# Altium footprint library IDETEC.PcbLib: 275 footprints (part 9 of 18) (continued)
## Logo de Ideas [mm] "logo de Idetec" (continued)
0.576,0.791 ; 0.093,1.451 0.423,1.451 ; 0.093,1.807 0.246,1.807 ; 0.093,1.832 0.246,1.832 ; 0.093,1.858 0.246,1.858 ; 0.093,1.883 0.22,1.883 ; 0.093,1.909 0.246,1.909 ; 0.119,1.477 0.423,1.477 ; 0.119,1.705 0.271,1.705 ; 0.119,1.731 0.271,1.731 ; 0.119,1.756 0.246,1.756 ; 0.119,1.782 0.246,1.782 ; 0.119,1.934 0.246,1.934 ; 0.119,1.959 0.246,1.959 ; 0.119,1.985 0.246,1.985 ; 0.119,2.01 0.271,2.01 ; 0.144,0.766 0.525,0.766 ; 0.144,1.502 0.398,1.502 ; 0.144,1.655 0.296,1.655 ; 0.144,1.68 0.271,1.68 ; 0.144,2.036 0.271,2.036 ; 0.144,2.061 0.296,2.061 ; 0.169,1.528 0.398,1.528 ; 0.169,1.578 0.474,1.578 ; 0.169,1.604 0.5,1.604 ; 0.169,1.629 0.322,1.629 ; 0.169,2.086 0.347,2.086 ; 0.169,2.112 0.601,2.112 ; 0.195,-0.327 0.449,-0.327 ; 0.195,-0.301 0.449,-0.301 ; 0.195,-0.276 0.449,-0.276 ; 0.195,-0.25 0.449,-0.25 ; 0.195,-0.225 0.449,-0.225 ; 0.195,-0.2 0.449,-0.2 ; 0.195,0.74 0.474,0.74 ; 0.195,1.553 0.449,1.553 ; 0.195,2.137 0.576,2.137 ; 0.22,-0.377 0.423,-0.377 ; 0.22,-0.352 0.423,-0.352 ; 0.22,-0.174 0.449,-0.174 ; 0.22,-0.149 0.423,-0.149 ; 0.22,-0.123 0.423,-0.123 ; 0.22,2.163 0.55,2.163 ; 0.246,-0.403 0.423,-0.403 ; 0.246,-0.098 0.398,-0.098 ; 0.271,-0.428 0.373,-0.428 ; 0.271,-0.073 0.373,-0.073 ; 0.271,0.715 0.373,0.715 ; 0.271,1.426 0.449,1.426 ; 0.271,2.188 0.5,2.188 ; 0.296,1.401 0.474,1.401 ; 0.322,1.35 0.5,1.35 ; 0.322,1.375 0.474,1.375 ; 0.347,1.324 0.525,1.324 ; 0.347,1.629 0.525,1.629 ; 0.347,2.213 0.449,2.213 ; 0.373,1.274 0.55,1.274 ; 0.373,1.299 0.525,1.299 ; 0.373,1.655 0.55,1.655 ; 0.398,1.248 0.576,1.248 ; 0.398,1.68 0.576,1.68 ; 0.423,-0.581 1.185,-0.581 ; 0.423,0.08 1.16,0.08 ; 0.423,1.223 0.601,1.223 ; 0.423,1.705 0.601,1.705 ; 0.423,2.086 0.601,2.086 ; 0.449,0.867 0.652,0.867 ; 0.449,1.172 0.627,1.172 ; 0.449,1.197 0.601,1.197 ; 0.449,1.731 0.601,1.731 ; 0.474,-0.555 1.135,-0.555 ; 0.474,0.054 1.109,0.054 ; 0.474,1.147 0.652,1.147 ; 0.474,1.756 0.627,1.756 ; 0.474,2.036 0.627,2.036 ; 0.474,2.061 0.627,2.061 ; 0.5,-0.53 1.109,-0.53 ; 0.5,0.029 1.084,0.029 ; 0.5,0.893 0.83,0.893 ; 0.5,1.096 0.804,1.096 ; 0.5,1.121 0.652,1.121 ; 0.5,1.782 0.627,1.782 ; 0.5,1.807 0.627,1.807 ; 0.5,1.832 0.627,1.832 ; 0.5,1.985 0.652,1.985 ; 0.5,2.01 0.627,2.01 ; 0.525,-0.504 1.084,-0.504 ; 0.525,-0.479 1.058,-0.479 ; 0.525,-0.022 1.058,-0.022 ; 0.525,0.004 1.058,0.004 ; 0.525,0.918 0.804,0.918 ; 0.525,1.07 0.804,1.07 ; 0.525,1.858 0.652,1.858 ; 0.525,1.883 0.652,1.883 ; 0.525,1.909 0.652,1.909 ; 0.525,1.934 0.652,1.934 ; 0.525,1.959 0.652,1.959 ; 0.55,-0.454 1.058,-0.454 ; 0.55,-0.428 1.033,-0.428 ; 0.55,-0.073 1.033,-0.073 ; 0.55,-0.047 1.033,-0.047 ; 0.55,0.943 0.804,0.943 ; 0.55,1.045 0.779,1.045 ; 0.576,-0.403 1.033,-0.403 ; 0.576,-0.377 1.008,-0.377 ; 0.576,-0.352 1.008,-0.352 ; 0.576,-0.149 1.008,-0.149 ; 0.576,-0.123 1.008,-0.123 ; 0.576,-0.098 1.033,-0.098 ; 0.576,0.969 0.779,0.969 ; 0.576,0.994 0.754,0.994 ; 0.576,1.02 0.779,1.02 ; 0.601,-0.327 1.008,-0.327 ; 0.601,-0.301 1.008,-0.301 ; 0.601,-0.276 1.008,-0.276 ; 0.601,-0.25 1.008,-0.25 ; 0.601,-0.225 1.008,-0.225 ; 0.601,-0.2 1.008,-0.2 ; 0.601,-0.174 1.008,-0.174 ; 0.677,0.842 0.855,0.842 ; 0.677,0.867 0.855,0.867 ; 0.677,1.121 0.83,1.121 ; 0.703,0.816 0.881,0.816 ; 0.703,1.147 0.83,1.147 ; 0.703,1.172 0.855,1.172 ; 0.728,0.791 0.906,0.791 ; 0.728,1.197 0.855,1.197 ; 0.728,1.223 0.855,1.223 ; 0.728,1.248 0.855,1.248 ; 0.754,0.766 0.931,0.766 ; 0.754,1.274 0.881,1.274 ; 0.754,1.299 0.881,1.299 ; 0.754,1.324 0.881,1.324 ; 0.754,1.35 0.881,1.35 ; 0.754,1.375 0.906,1.375 ; 0.779,0.74 0.931,0.74 ; 0.779,1.401 0.906,1.401 ; 0.779,1.426 0.906,1.426 ; 0.779,1.451 0.906,1.451 ; 0.779,1.477 0.906,1.477 ; 0.779,1.502 0.906,1.502 ; 0.779,1.528 0.931,1.528 ; 1.109,-0.631 1.363,-0.631 ; 1.16,-0.352 1.363,-0.352 ; 1.16,-0.327 1.363,-0.327 ; 1.16,-0.301 1.363,-0.301 ; 1.16,-0.276 1.389,-0.276 ; 1.16,-0.25 1.389,-0.25 ; 1.16,-0.225 1.389,-0.225 ; 1.16,-0.2 1.389,-0.2 ; 1.16,-0.174 1.363,-0.174 ; 1.16,-0.149 1.363,-0.149 ; 1.16,-0.123 1.363,-0.123 ; 1.185,-0.682 1.363,-0.682 ; 1.185,-0.657 1.363,-0.657 ; 1.185,-0.403 1.338,-0.403 ; 1.185,-0.377 1.338,-0.377 ; 1.185,-0.098 1.338,-0.098 ; 1.211,-0.073 1.338,-0.073 ; 1.236,-0.708 1.287,-0.708 ; 1.236,-0.428 1.287,-0.428 ; 1.236,-0.047 1.287,-0.047 ; 1.262,-0.581 1.363,-0.581 ; 1.312,-0.555 1.363,-0.555 ; 1.312,0.08 1.389,0.08 ; 1.338,-0.53 1.389,-0.53 ; 1.338,0.054 1.389,0.054 ; 1.363,-0.504 1.389,-0.504 ; 1.363,0.029 1.389,0.029 ; 1.389,-0.835 3.776,-0.835 ; 1.439,-0.809 3.776,-0.809 ; 1.465,-0.784 3.776,-0.784 ; 1.465,-0.758 3.776,-0.758 ; 1.49,-0.733 3.776,-0.733 ; 1.49,-0.708 3.776,-0.708 ; 1.516,-0.682 3.776,-0.682 ; 1.516,-0.657 3.776,-0.657 ; 1.516,-0.631 3.776,-0.631 ; 1.516,-0.606 3.776,-0.606 ; 1.516,-0.581 1.998,-0.581 ; 1.516,-0.555 1.998,-0.555 ; 1.516,-0.53 1.998,-0.53 ; 1.516,-0.504 1.998,-0.504 ; 1.516,-0.479 1.998,-0.479 ; 1.516,-0.454 1.998,-0.454 ; 1.516,-0.428 1.998,-0.428 ; 1.516,-0.403 1.998,-0.403 ; 1.516,-0.377 1.998,-0.377 ; 1.516,-0.352 1.998,-0.352 ; 1.516,-0.327 1.998,-0.327 ; 1.516,-0.301 1.998,-0.301 ; 1.516,-0.276 1.998,-0.276 ; 1.516,-0.25 1.998,-0.25 ; 1.516,-0.225 1.998,-0.225 ; 1.516,-0.2 1.998,-0.2 ; 1.516,-0.174 1.998,-0.174 ; 1.516,-0.149 1.998,-0.149 ; 1.516,-0.123 1.998,-0.123 ; 1.516,-0.098 1.998,-0.098 ; 1.516,-0.073 1.998,-0.073 ; 1.516,-0.047 1.998,-0.047 ; 1.516,-0.022 1.998,-0.022 ; 1.516,0.004 1.998,0.004 ; 1.516,0.029 1.998,0.029 ; 1.516,0.054 1.998,0.054 ; 1.516,0.08 1.998,0.08 ; 2.074,0.181 3.776,0.181 ; 2.1,0.207 3.776,0.207 ; 2.1,0.232 3.776,0.232 ; 2.125,-0.581 2.481,-0.581 ; 2.125,-0.555 2.455,-0.555 ; 2.125,-0.53 2.43,-0.53 ; 2.125,-0.504 2.405,-0.504 ; 2.125,-0.479 2.405,-0.479 ; 2.125,-0.454 2.379,-0.454 ; 2.125,-0.428 2.379,-0.428 ; 2.125,-0.403 2.379,-0.403 ; 2.125,-0.377 2.379,-0.377 ; 2.125,-0.352 2.379,-0.352 ; 2.125,-0.327 2.405,-0.327 ; 2.125,-0.301 2.405,-0.301 ; 2.125,-0.276 2.43,-0.276 ; 2.125,-0.25 2.43,-0.25 ; 2.125,-0.225 2.481,-0.225 ; 2.125,-0.2 2.532,-0.2 ; 2.125,-0.174 2.633,-0.174 ; 2.125,-0.149 2.709,-0.149 ; 2.125,-0.123 2.506,-0.123 ; 2.125,-0.098 2.405,-0.098 ; 2.125,-0.073 2.405,-0.073 ; 2.125,-0.047 2.405,-0.047 ; 2.125,-0.022 2.43,-0.022 ; 2.125,0.004 2.43,0.004 ; 2.125,0.029 2.455,0.029 ; 2.125,0.054 2.481,0.054 ; 2.125,0.08 2.532,0.08 ; 2.125,0.258 3.776,0.258 ; 2.151,0.283 3.776,0.283 ; 2.176,0.308 3.776,0.308 ; 2.176,0.334 3.776,0.334 ; 2.532,-0.428 2.684,-0.428 ; 2.532,-0.403 2.684,-0.403 ; 2.532,-0.377 2.709,-0.377 ; 2.532,-0.352 2.709,-0.352 ; 2.532,-0.123 2.709,-0.123 ; 2.532,-0.098 2.709,-0.098 ; 2.557,-0.454 2.659,-0.454 ; 2.557,-0.327 2.709,-0.327 ; 2.557,-0.073 2.684,-0.073 ; 2.582,-0.047 2.659,-0.047 ; 2.608,-0.301 2.709,-0.301 ; 2.633,-0.581 2.735,-0.581 ; 2.684,-0.555 2.735,-0.555 ; 2.684,-0.276 2.709,-0.276 ; 2.709,-0.53 2.735,-0.53 ; 2.735,0.08 3.776,0.08 ; 2.786,0.054 3.776,0.054 ; 2.811,0.029 3.776,0.029 ; 2.836,-0.403 3.776,-0.403 ; 2.836,-0.377 3.776,-0.377 ; 2.836,-0.352 3.776,-0.352 ; 2.836,-0.327 3.776,-0.327 ; 2.836,-0.301 3.776,-0.301 ; 2.836,-0.276 3.776,-0.276 ; 2.836,-0.25 3.776,-0.25 ; 2.836,-0.225 3.776,-0.225 ; 2.836,-0.2 3.776,-0.2 ; 2.836,-0.174 3.776,-0.174 ; 2.836,-0.149 3.776,-0.149 ; 2.836,-0.123 3.776,-0.123 ; 2.836,-0.098 3.776,-0.098 ; 2.836,-0.073 3.776,-0.073 ; 2.836,-0.047 3.776,-0.047 ; 2.836,-0.022 3.776,-0.022 ; 2.836,0.004 3.776,0.004 ; 2.862,-0.581 3.776,-0.581 ; 2.862,-0.555 3.776,-0.555 ; 2.862,-0.53 3.776,-0.53 ; 2.862,-0.504 3.776,-0.504 ; 2.862,-0.479 3.776,-0.479 ; 2.862,-0.454 3.776,-0.454 ; 2.862,-0.428 3.776,-0.428 ; 4.056,0.131 6.215,0.131 ; 4.056,0.156 4.411,0.156 ; 4.081,0.105 4.259,0.105 ; 4.081,0.181 4.411,0.181 ; 4.081,0.207 4.411,0.207 ; 4.081,0.232 4.411,0.232 ; 4.081,0.258 4.411,0.258 ; 4.081,0.283 4.437,0.283 ; 4.081,0.308 4.437,0.308 ; 4.106,0.08 4.259,0.08 ; 4.106,0.334 4.437,0.334 ; 4.106,0.359 4.437,0.359 ; 4.132,0.054 4.233,0.054 ; 4.157,0.029 4.233,0.029 ; 4.157,0.385 4.411,0.385 ; 4.183,0.004 4.208,0.004 ; 4.183,2.163 4.31,2.163 ; 4.208,0.41 4.386,0.41 ; 4.208,2.137 4.614,2.137 ; 4.259,-0.073 6.215,-0.073 ; 4.259,-0.047 6.215,-0.047 ; 4.259,-0.022 6.215,-0.022 ; 4.259,0.004 6.215,0.004 ; 4.259,0.435 4.386,0.435 ; 4.259,2.112 4.31,2.112 ; 4.284,0.029 6.215,0.029 ; 4.284,0.054 6.215,0.054 ; 4.284,0.08 6.215,0.08 ; 4.284,0.105 6.215,0.105 ; 4.31,-0.098 6.215,-0.098 ; 4.31,0.461 4.36,0.461 ; 4.31,2.086 4.335,2.086 ; 4.335,-0.301 6.189,-0.301 ; 4.335,-0.276 6.215,-0.276 ; 4.335,-0.25 6.215,-0.25 ; 4.335,-0.225 6.215,-0.225 ; 4.335,-0.2 6.215,-0.2 ; 4.335,-0.174 6.215,-0.174 ; 4.335,-0.149 6.215,-0.149 ; 4.335,-0.123 6.215,-0.123 ; 4.335,2.112 4.97,2.112 ; 4.36,-0.327 6.189,-0.327 ; 4.386,-0.352 6.189,-0.352 ; 4.386,2.061 5.072,2.061 ; 4.386,2.086 5.021,2.086 ; 4.411,-0.403 4.614,-0.403 ; 4.411,-0.377 6.189,-0.377 ; 4.411,2.036 4.462,2.036 ; 4.437,-0.428 4.589,-0.428 ; 4.437,0.156 6.215,0.156 ; 4.437,0.181 6.215,0.181 ; 4.462,-0.454 4.589,-0.454 ; 4.462,0.207 6.189,0.207 ; 4.462,0.232 6.189,0.232 ; 4.487,-0.479 4.564,-0.479 ; 4.487,0.258 6.189,0.258 ; 4.487,0.283 6.189,0.283 ; 4.487,2.01 4.513,2.01 ; 4.487,2.036 4.538,2.036 ; 4.513,-0.53 4.538,-0.53 ; 4.513,-0.504 4.564,-0.504 ; 4.513,0.308 6.189,0.308 ; 4.513,0.334 6.189,0.334 ; 4.513,0.359 6.189,0.359 ; 4.513,0.385 6.189,0.385 ; 4.513,0.41 6.164,0.41 ; 4.538,0.435 6.164,0.435 ; 4.538,0.461 6.164,0.461 ; 4.538,0.486 6.164,0.486 ; 4.538,0.512 6.164,0.512 ; 4.538,0.537 6.138,0.537 ; 4.538,0.562 6.138,0.562 ; 4.564,0.588 6.138,0.588 ; 4.589,0.613 6.138,0.613 ; 4.589,0.639 6.113,0.639 ; 4.589,2.036 5.122,2.036 ; 4.614,0.664 6.113,0.664 ; 4.614,1.604 4.868,1.604 ; 4.614,1.629 4.894,1.629 ; 4.614,1.655 4.894,1.655 ; 4.614,2.01 4.792,2.01 ; 4.64,-0.403 4.691,-0.403 ; 4.64,0.689 6.113,0.689 ; 4.64,0.715 6.113,0.715 ; 4.64,1.553 4.843,1.553 ; 4.64,1.578 4.868,1.578 ; 4.64,1.68 4.919,1.68 ; 4.64,1.985 4.741,1.985 ; 4.665,0.74 6.088,0.74 ; 4.665,1.502 4.818,1.502 ; 4.665,1.528 4.843,1.528 ; 4.665,1.705 4.919,1.705 ; 4.665,1.731 4.945,1.731 ; 4.665,1.959 4.691,1.959 ; 4.691,0.766 6.088,0.766 ; 4.691,0.791 6.088,0.791 ; 4.691,1.477 4.818,1.477 ; 4.691,1.756 5.478,1.756 ; 4.716,-0.403 6.189,-0.403 ; 4.716,0.816 6.062,0.816 ; 4.716,0.842 4.843,0.842 ; 4.716,1.426 4.767,1.426 ; 4.716,1.451 4.767,1.451 ; 4.741,0.867 4.792,0.867 ; 4.741,0.893 4.843,0.893 ; 4.741,0.918 4.868,0.918 ; 4.767,0.943 4.868,0.943 ; 4.767,0.969 4.868,0.969 ; 4.767,1.782 5.453,1.782 ; 4.792,0.994 4.868,0.994 ; 4.792,1.02 4.868,1.02 ; 4.818,1.045 4.894,1.045 ; 4.818,1.07 4.945,1.07 ; 4.818,1.807 5.427,1.807 ; 4.818,1.985 5.199,1.985 ; 4.818,2.01 5.148,2.01 ; 4.843,-0.428 6.189,-0.428 ; 4.843,1.096 5.021,1.096 ; 4.843,1.832 5.402,1.832 ; 4.843,1.858 5.376,1.858 ; 4.843,1.959 5.249,1.959 ; 4.868,-0.479 6.189,-0.479 ; 4.868,-0.454 6.189,-0.454 ; 4.868,0.842 6.062,0.842 ; 4.868,1.121 5.046,1.121 ; 4.868,1.883 5.351,1.883 ; 4.868,1.909 5.3,1.909 ; 4.868,1.934 5.275,1.934 ; 4.894,-0.555 6.164,-0.555 ; 4.894,-0.53 6.164,-0.53 ; 4.894,-0.504 6.164,-0.504 ; 4.894,1.147 5.173,1.147 ; 4.919,-0.606 6.164,-0.606 ; 4.919,-0.581 6.164,-0.581 ; 4.919,1.172 5.249,1.172 ; 4.945,0.867 6.062,0.867 ; 4.945,0.893 6.037,0.893 ; 4.945,1.197 5.249,1.197 ; 4.97,1.223 5.122,1.223 ; 4.995,1.731 5.503,1.731 ; 5.021,0.918 6.037,0.918 ; 5.021,1.705 5.529,1.705 ; 5.046,1.629 5.605,1.629 ; 5.046,1.655 5.58,1.655 ; 5.046,1.68 5.554,1.68 ; 5.072,-0.657 6.138,-0.657 ; 5.072,-0.631 6.138,-0.631 ; 5.072,0.943 6.011,0.943 ; 5.072,1.121 5.122,1.121 ; 5.072,1.553 5.681,1.553 ; 5.072,1.578 5.656,1.578 ; 5.072,1.604 5.63,1.604 ; 5.097,-0.682 6.138,-0.682 ; 5.097,1.096 5.148,1.096 ; 5.097,1.477 5.732,1.477 ; 5.097,1.502 5.707,1.502 ; 5.097,1.528 5.707,1.528 ; 5.122,-0.733 6.138,-0.733 ; 5.122,-0.708 6.138,-0.708 ; 5.122,1.426 5.757,1.426 ; 5.122,1.451 5.757,1.451 ; 5.148,-0.809 6.113,-0.809 ; 5.148,-0.784 6.113,-0.784 ; 5.148,-0.758 6.113,-0.758 ; 5.148,0.969 6.011,0.969 ; 5.148,0.994 5.3,0.994 ; 5.148,1.02 5.3,1.02 ; 5.173,1.401 5.783,1.401 ; 5.199,-2.054 5.224,-2.054 ; 5.199,-2.028 5.275,-2.028 ; 5.199,-2.003 5.326,-2.003 ; 5.199,-1.978 5.376,-1.978 ; 5.199,-1.952 5.402,-1.952 ; 5.199,-1.927 5.427,-1.927 ; 5.199,-0.835 6.088,-0.835 ; 5.199,1.147 5.249,1.147 ; 5.199,1.223 5.249,1.223 ; 5.199,1.248 5.249,1.248 ; 5.199,1.274 5.249,1.274 ; 5.199,1.299 5.275,1.299 ; 5.199,1.324 5.3,1.324 ; 5.199,1.375 5.808,1.375 ; 5.224,-1.901 5.478,-1.901 ; 5.224,-1.876 5.503,-1.876 ; 5.224,-1.851 5.529,-1.851 ; 5.224,-1.825 5.554,-1.825 ; 5.224,1.045 5.3,1.045 ; 5.224,1.07 5.275,1.07 ; 5.224,1.121 5.249,1.121 ; 5.224,1.35 5.808,1.35 ; 5.249,-1.8 5.58,-1.8 ; 5.249,1.096 5.275,1.096 ; 5.275,-1.774 5.58,-1.774 ; 5.3,-1.749 5.605,-1.749 ; 5.3,1.147 5.326,1.147 ; 5.326,-1.724 5.63,-1.724 ; 5.326,0.994 6.011,0.994 ; 5.326,1.096 5.961,1.096 ; 5.326,1.121 5.935,1.121 ; 5.351,-1.698 5.656,-1.698 ; 5.351,-1.673 5.681,-1.673 ; 5.351,-0.86 6.088,-0.86 ; 5.351,1.02 5.986,1.02 ; 5.351,1.045 5.986,1.045 ; 5.351,1.07 5.961,1.07 ; 5.376,-1.647 5.681,-1.647 ; 5.376,-1.622 5.707,-1.622 ; 5.376,1.147 5.935,1.147 ; 5.376,1.324 5.834,1.324 ; 5.402,-1.597 5.732,-1.597 ; 5.402,-1.571 5.732,-1.571 ; 5.402,-0.885 6.088,-0.885 ; 5.402,1.172 5.91,1.172 ; 5.402,1.299 5.834,1.299 ; 5.427,-1.546 5.757,-1.546 ; 5.427,-1.52 5.783,-1.52 ; 5.427,-0.911 6.062,-0.911 ; 5.427,1.197 5.91,1.197 ; 5.427,1.223 5.884,1.223 ; 5.427,1.248 5.884,1.248 ; 5.427,1.274 5.859,1.274 ; 5.453,-1.495 5.783,-1.495 ; 5.453,-1.47 5.808,-1.47 ; 5.453,-0.962 6.062,-0.962 ; 5.453,-0.936 6.062,-0.936 ; 5.478,-1.444 5.834,-1.444 ; 5.478,-1.419 5.834,-1.419 ; 5.478,-1.393 5.859,-1.393 ; 5.478,-1.368 5.859,-1.368 ; 5.478,-1.343 5.884,-1.343 ; 5.478,-1.317 5.884,-1.317 ; 5.478,-1.292 5.91,-1.292 ; 5.478,-1.266 5.935,-1.266 ; 5.478,-1.241 5.935,-1.241 ; 5.478,-1.216 5.961,-1.216 ; 5.478,-1.19 5.961,-1.19 ; 5.478,-1.063 6.011,-1.063 ; 5.478,-1.038 6.037,-1.038 ; 5.478,-1.012 6.037,-1.012 ; 5.478,-0.987 6.037,-0.987 ; 5.503,-1.165 5.986,-1.165 ; 5.503,-1.139 5.986,-1.139 ; 5.503,-1.114 5.986,-1.114 ; 5.503,-1.089 6.011,-1.089
  lines w0.03: -2.853,0.74 -2.853,2.188 ; -2.701,0.875 -2.701,2.036 ; -2.244,1.433 -2.244,1.553
Top Solder:
  rectangle: -4.488,0.332 1.112,2.332
  rectangle: -5.488,-1.068 4.012,0.532
  rectangle: -4.488,-2.168 6.312,2.332
  rectangle: -5.488,-2.168 -3.788,0.532

## LOGO IDETEC 2012 [mm]
height 0.2
Top Layer:
  drawing of 2034 lines, arcs and shapes, not listed

## Logo UPS-G [mm]
Top Layer:
  drawing of 1765 lines, arcs and shapes, not listed
Top Solder:
  region: -6.493,-1.912 -6.493,1.768 -6.493,1.868 -6.417,2.051 -6.276,2.192 -6.092,2.268 -5.993,2.268 4.967,2.268 5.067,2.268 5.25,2.192 5.391,2.051 5.467,1.868 5.467,1.768 5.467,-1.912 5.467,-2.011 5.391,-2.195 5.25,-2.336 5.067,-2.412 4.967,-2.412 -5.993,-2.412 -6.092,-2.412 -6.276,-2.336 -6.417,-2.195 -6.493,-2.011

## LQFP-48 [mil] "LQFP-48"
pads (48):
  rect 10x45 smd: 1(-108.27,-167.32) 2(-88.58,-167.32) 3(-68.9,-167.32) 4(-49.21,-167.32) 5(-29.53,-167.32) 6(-9.84,-167.32) 7(9.84,-167.32) 8(29.53,-167.32) 9(49.21,-167.32) 10(68.9,-167.32) 11(88.58,-167.32) 12(108.27,-167.32) 25(108.27,167.32) 26(88.58,167.32) 27(68.9,167.32) 28(49.21,167.32) 29(29.53,167.32) 30(9.84,167.32) 31(-9.84,167.32) 32(-29.53,167.32) 33(-49.21,167.32) 34(-68.9,167.32) 35(-88.58,167.32) 36(-108.27,167.32)
  rect 45x10 smd: 13(167.32,-108.27) 14(167.32,-88.58) 15(167.32,-68.9) 16(167.32,-49.21) 17(167.32,-29.53) 18(167.32,-9.84) 19(167.32,9.84) 20(167.32,29.53) 21(167.32,49.21) 22(167.32,68.9) 23(167.32,88.58) 24(167.32,108.27) 37(-167.32,108.27) 38(-167.32,88.58) 39(-167.32,68.9) 40(-167.32,49.21) 41(-167.32,29.53) 42(-167.32,9.84) 43(-167.32,-9.84) 44(-167.32,-29.53) 45(-167.32,-49.21) 46(-167.32,-68.9) 47(-167.32,-88.58) 48(-167.32,-108.27)
Top Overlay:
  circle w10: c-78.74,-78.74 r23.62
  lines w10: -132.87,-122.05 -132.87,122.05 -122.05,132.87 122.05,132.87 132.87,122.05 132.87,-122.05 122.05,-132.87 -122.05,-132.87 -132.87,-122.05
Mechanical 16:
  rectangle: -177.17,-112.2 -135.83,-104.33
  rectangle: -177.17,-92.52 -135.83,-84.65
  rectangle: -177.17,-72.83 -135.83,-64.96
  rectangle: -177.17,-53.15 -135.83,-45.28
  rectangle: -177.17,-33.46 -135.83,-25.59
  rectangle: -177.17,-13.78 -135.83,-5.91
  rectangle: -177.17,5.91 -135.83,13.78
  rectangle: -177.17,25.59 -135.83,33.46
  rectangle: -177.17,45.28 -135.83,53.15
  rectangle: -177.17,64.96 -135.83,72.83
  rectangle: -177.17,84.65 -135.83,92.52
  rectangle: -177.17,104.33 -135.83,112.2
  rectangle: -112.2,135.83 -104.33,177.17
  rectangle: -92.52,135.83 -84.65,177.17
  rectangle: -72.83,135.83 -64.96,177.17
  rectangle: -53.15,135.83 -45.28,177.17
  rectangle: -33.46,135.83 -25.59,177.17
  rectangle: -13.78,135.83 -5.91,177.17
  rectangle: 5.91,135.83 13.78,177.17
  rectangle: 25.59,135.83 33.46,177.17
  rectangle: 45.28,135.83 53.15,177.17
  rectangle: 64.96,135.83 72.83,177.17
  rectangle: 84.65,135.83 92.52,177.17
  rectangle: 104.33,135.83 112.2,177.17
  rectangle: 135.83,104.33 177.17,112.2
  rectangle: 135.83,84.65 177.17,92.52
  rectangle: 135.83,64.96 177.17,72.83
  rectangle: 135.83,45.28 177.17,53.15
  rectangle: 135.83,25.59 177.17,33.46
  rectangle: 135.83,5.91 177.17,13.78
  rectangle: 135.83,-13.78 177.17,-5.91
  rectangle: 135.83,-33.46 177.17,-25.59
  rectangle: 135.83,-53.15 177.17,-45.28
  rectangle: 135.83,-72.83 177.17,-64.96
  rectangle: 135.83,-92.52 177.17,-84.65
  rectangle: 135.83,-112.2 177.17,-104.33
  rectangle: 104.33,-177.17 112.2,-135.83
  rectangle: 84.65,-177.17 92.52,-135.83
  rectangle: 64.96,-177.17 72.83,-135.83
  rectangle: 45.28,-177.17 53.15,-135.83
  rectangle: 25.59,-177.17 33.46,-135.83
  rectangle: 5.91,-177.17 13.78,-135.83
  rectangle: -13.78,-177.17 -5.91,-135.83
  rectangle: -33.46,-177.17 -25.59,-135.83
  rectangle: -53.15,-177.17 -45.28,-135.83
  rectangle: -72.83,-177.17 -64.96,-135.83
  rectangle: -92.52,-177.17 -84.65,-135.83
  rectangle: -112.2,-177.17 -104.33,-135.83
3D body "SW3dPS-Quad50M48.STEP": height 61.42, standoff 0, extent -177.14,-177.16 177.19,177.17

## LS4148_LS4448 [mm] "1N4148"
pads (2):
  rect 1.5x2.2 smd: 1(-1.875,0) 2(1.875,0)
Top Overlay:
  region: 1.651,0.762 0.762,0.762 0.762,-0.762 1.651,-0.762
  lines w0.1: -1.65,-0.8 -1.65,0.8 1.65,0.8 1.65,-0.8 -1.65,-0.8
3D body "SW3dPS-SOD80.STEP": height 1.6, standoff 0, extent -1.875,-0.8 1.825,0.8

## MF05A_N [mm] "SOT23, 5-Leads, Body 2.9x1.6mm, Pitch 0.95mm, Lead Span 2.8mm, IPC Medium Density"
height 1.22
pads (5):
  rect 1.1x0.65 smd: 1(-1.2,0.95) 2(-1.2,0) 3(-1.2,-0.95) 4(1.2,-0.95) 5(1.2,0.95)
Top Overlay:
  circle w0.25: c-1.2,1.825 r0.125
  lines w0.2: -0.25,-1.55 -0.25,1.55 0.25,1.55 0.25,-1.55 -0.25,-1.55
Mechanical 13:
  lines w0.1: -0.9,-1.55 0.9,-1.55 0.9,1.55 -0.9,1.55 -0.9,-1.55
Mechanical 15:
  lines w0.1: -0.5,0 0.5,0 ; 0,-0.5 0,0.5 ; -1.987,-1.8 2,-1.8 2,1.8 -1.987,1.8 -1.987,-1.8
3D body "User Library-SOT-23-5-1.STEP": height 1.1, standoff 0, extent -1.25,-1.5 1.25,1.5

## MI0805K400R-10 - duplicate [mm] "Suppressors & Ferrite"
height 2
pads (2):
  rect 1.285x1.47 smd: 1(-0.972,0) 2(0.972,0)
Top Overlay:
  lines w0.1: -1,-0.625 -1,0.625 1,0.625 1,-0.625 -1,-0.625

## MIC29302AWD [mm] "MIC29302AWD"
pads (6):
  rect 0.76x2 smd: 1(-2.54,-4.91) 2(-1.27,-4.91) 4(1.27,-4.91) 5(2.54,-4.91) ""(-0.025,-4.91)
  rect 7x6 smd: 3(0,1.865)
Top Overlay:
  lines w0.254: -3.302,-3.1 -3.302,3.1 3.302,3.1 3.302,-3.1 -3.302,-3.1
3D body "User Library-DPAK-5-1.STEP": height 2.4, standoff -0.01, extent -3.36,-5.826 3.34,5.04